# Altium footprint library PcbLib_jp.PcbLib: 255 footprints (part 8 of 16)
Each footprint in its own frame and in the unit in brackets; x right, y up, seen from the top. Pads: shape width x height; smd on the part's side, far side on the other; paste and mask are expansions set on the pad; w line width, h text height; cw(c..) or ccw(c..) is an arc to the next point about the centre after c.
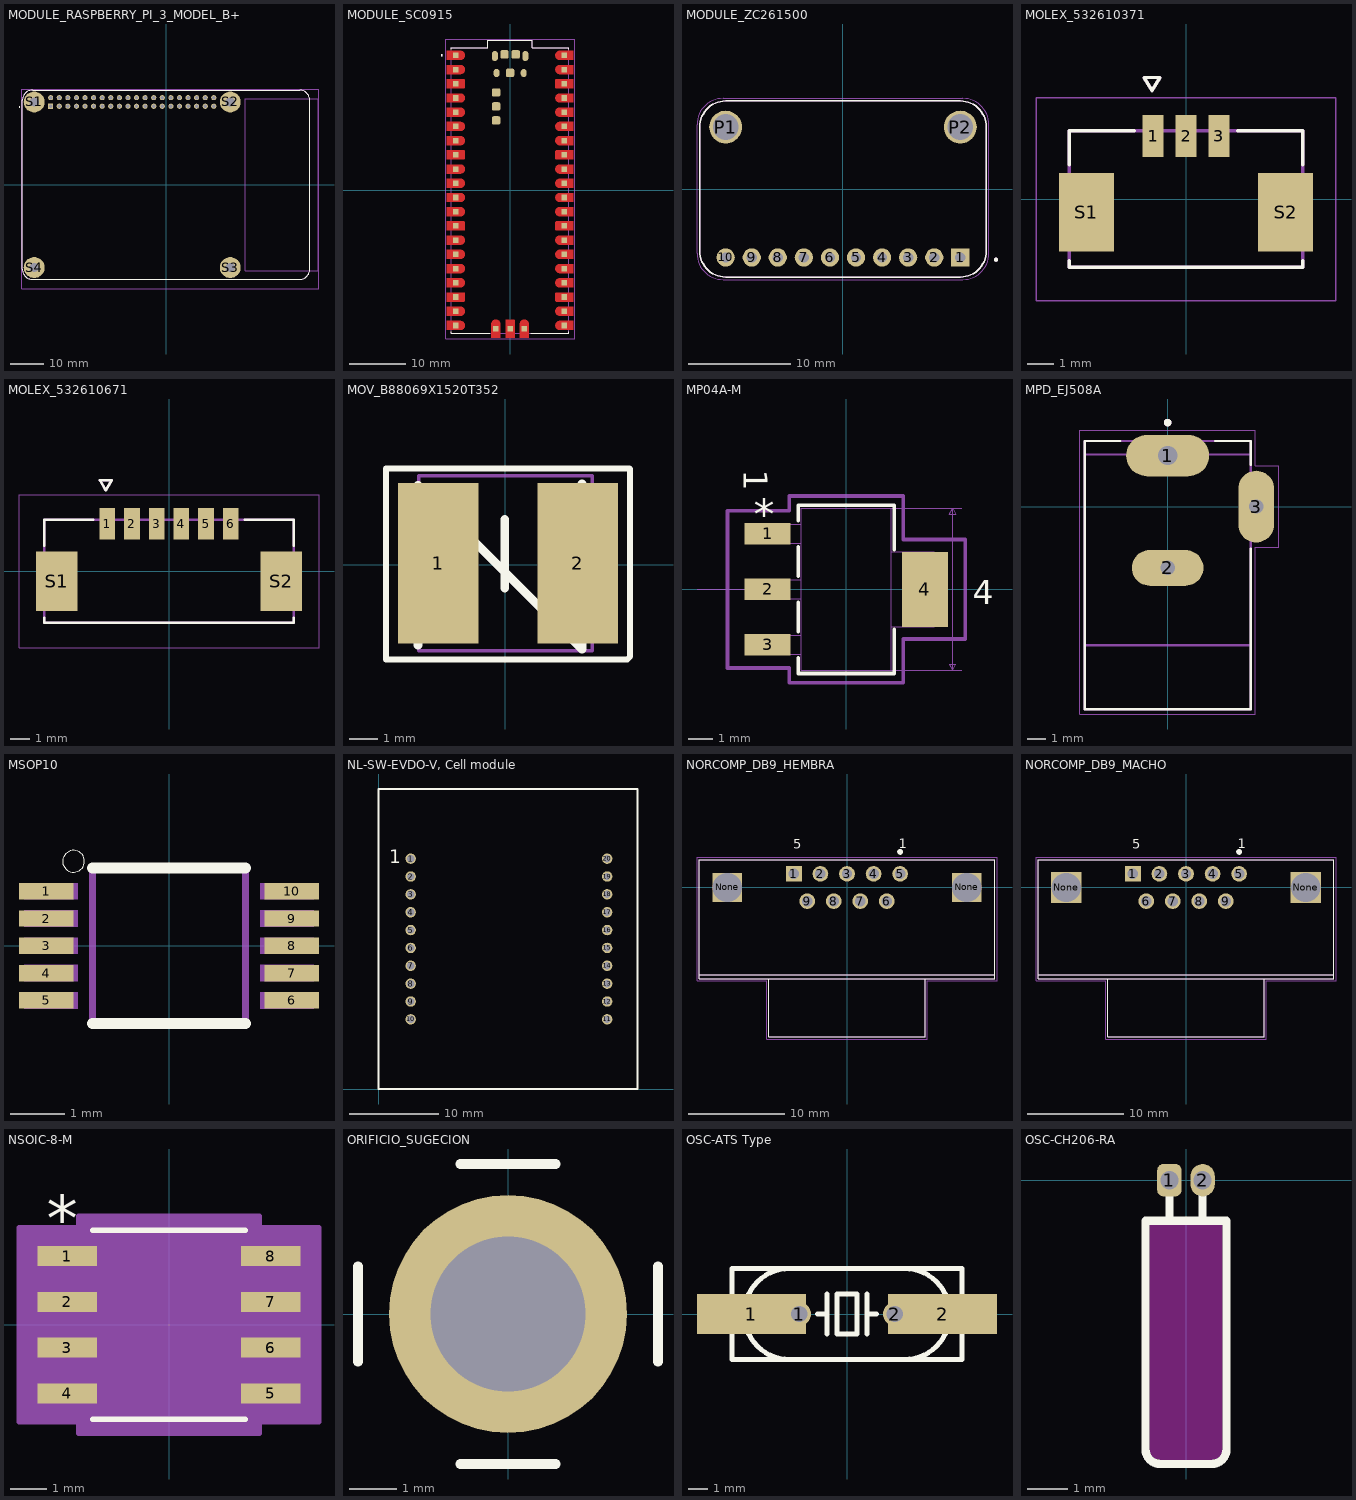
[diagram p7: the footprints below, top view; thin cyan lines are the x and y axes]

## MODULE_RASPBERRY_PI_3_MODEL_B+ [mil]
pads (44):
  rect 60x60 hole 40: 1(-1343.7,914.57)
  round 60 hole 40: 2(-1343.7,1014.57) 3(-1243.7,914.57) 4(-1243.7,1014.57) 5(-1143.7,914.57) 6(-1143.7,1014.57) 7(-1043.7,914.57) 8(-1043.7,1014.57) 9(-943.7,914.57) 10(-943.7,1014.57) 11(-843.7,914.57) 12(-843.7,1014.57) 13(-743.7,914.57) 14(-743.7,1014.57) 15(-643.7,914.57) 16(-643.7,1014.57) 17(-543.7,914.57) 18(-543.7,1014.57) 19(-443.7,914.57) 20(-443.7,1014.57) 21(-343.7,914.57) 22(-343.7,1014.57) 23(-243.7,914.57) 24(-243.7,1014.57) 25(-143.7,914.57) 26(-143.7,1014.57) 27(-43.7,914.57) 28(-43.7,1014.57) 29(56.3,914.57) 30(56.3,1014.57) 31(156.3,914.57) 32(156.3,1014.57) 33(256.3,914.57) 34(256.3,1014.57) 35(356.3,914.57) 36(356.3,1014.57) 37(456.3,914.57) 38(456.3,1014.57) 39(556.3,914.57) 40(556.3,1014.57)
  round 244.09 hole 108.27: S1(-1535.43,964.57) S2(748.03,964.57) S3(748.03,-964.57) S4(-1535.43,-964.57)
Top Overlay:
  circle w7.87: c-1708.66,905.51 r3.94
  lines w5: -1673.23,-984.25 ccw(c-1555.12,-984.25) -1555.12,-1102.36 1555.12,-1102.36 ccw(c1555.12,-984.25) 1673.23,-984.25 1673.23,984.25 ccw(c1555.12,984.25) 1555.12,1102.36 -1555.12,1102.36 ccw(c-1555.12,984.25) -1673.23,984.25 -1673.23,-984.25
Mechanical 13:
  circle w7.87: c-1708.66,905.51 r3.94
  lines w5: -1673.23,-984.25 ccw(c-1555.12,-984.25) -1555.12,-1102.36 1555.12,-1102.36 ccw(c1555.12,-984.25) 1673.23,-984.25 1673.23,984.25 ccw(c1555.12,984.25) 1555.12,1102.36 -1555.12,1102.36 ccw(c-1555.12,984.25) -1673.23,984.25 -1673.23,-984.25 ; 925.2,-1003.94 925.2,1003.94 1771.65,1003.94 1771.65,-1003.94 925.2,-1003.94
Mechanical 15:
  lines w1.97: -1683.07,-1210.63 1781.5,-1210.63 1781.5,1112.2 -1683.07,1112.2 -1683.07,-1210.63
3D body "User Library-Raspberry Pi 3-1.step": height 688.58, standoff -72.83, extent -1676.61,-1150.03 1763.23,1106.3

## MODULE_SC0915 [mm]
pads (53):
  rect 1x1 smd paste-1 mask+0: 1(-9.69,24.13) 2(-9.69,21.59) 3(-9.69,19.05) 4(-9.69,16.51) 5(-9.69,13.97) 6(-9.69,11.43) 7(-9.69,8.89) 8(-9.69,6.35) 9(-9.69,3.81) 10(-9.69,1.27) 11(-9.69,-1.27) 12(-9.69,-3.81) 13(-9.69,-6.35) 14(-9.69,-8.89) 15(-9.69,-11.43) 16(-9.69,-13.97) 17(-9.69,-16.51) 18(-9.69,-19.05) 19(-9.69,-21.59) 20(-9.69,-24.13) 21(9.69,-24.13) 22(9.69,-21.59) 23(9.69,-19.05) 24(9.69,-16.51) 25(9.69,-13.97) 26(9.69,-11.43) 27(9.69,-8.89) 28(9.69,-6.35) 29(9.69,-3.81) 30(9.69,-1.27) 31(9.69,1.27) 32(9.69,3.81) 33(9.69,6.35) 34(9.69,8.89) 35(9.69,11.43) 36(9.69,13.97) 37(9.69,16.51) 38(9.69,19.05) 39(9.69,21.59) 40(9.69,24.13) D1(-2.54,-24.7) D2(0,-24.7) D3(2.54,-24.7)
  oval 1.1x1.8 smd: A(-2.725,24) B(2.725,24)
  oval 1.05x1.45 smd: C(-2.425,20.97) D(2.425,20.97)
  rrect40% 1.5x1.5 smd: TP1(0,21) TP2(1,24.3) TP3(-1,24.3) TP4(-2.5,17.5) TP5(-2.5,15) TP6(-2.5,12.5)
Top Layer:
  drawing of 43 lines, arcs and shapes, not listed
Top Overlay:
  circle w0.2: c-12.19,24.13 r0.1
  lines w0.127: -10.5,-25.25 -10.5,-25.5 -3.66,-25.5 ; -10.5,25.25 -10.5,25.5 -4,25.5 -4,26.8 4,26.8 4,25.5 10.5,25.5 10.5,25.25 ; 3.66,-25.5 10.5,-25.5 10.5,-25.25
Top Paste:
  drawing of 43 lines, arcs and shapes, not listed
Top Solder:
  drawing of 43 lines, arcs and shapes, not listed
Mechanical 13:
  circle w0.2: c-12.19,24.13 r0.1
  lines w0.127: -10.5,-25.5 10.5,-25.5 10.5,25.5 4,25.5 4,26.8 -4,26.8 -4,25.5 -10.5,25.5 -10.5,-25.5
Mechanical 15:
  lines w0.05: -11.54,-26.55 11.54,-26.55 11.54,27.05 -11.54,27.05 -11.54,-26.55
3D body "step_temp.STEP": height 3.73, standoff 0, extent -10.5,-25.5 10.5,26.8

## MODULE_ZC261500 [mil]
pads (12):
  rect 70x70 hole 39.37: 1(450,-262.5)
  round 70 hole 39.37: 2(350,-262.5) 3(250,-262.5) 4(150,-262.5) 5(50,-262.5) 6(-50,-262.5) 7(-150,-262.5) 8(-250,-262.5) 9(-350,-262.5) 10(-450,-262.5)
  round 125.98 hole 98.43: P1(-450,237.5) P2(450,237.5)
Top Overlay:
  circle w7.87: c586.69,-271.14 r3.94
  lines w5: -550,-237.5 ccw(c-450,-237.5) -450,-337.5 450,-337.5 ccw(c450,-237.5) 550,-237.5 550,237.5 ccw(c450,237.5) 450,337.5 -450,337.5 ccw(c-450,237.5) -550,237.5 -550,-237.5
Mechanical 13:
  circle w7.87: c586.69,-271.14 r3.94
  lines w5: -550,-237.5 ccw(c-450,-237.5) -450,-337.5 450,-337.5 ccw(c450,-237.5) 550,-237.5 550,237.5 ccw(c450,237.5) 450,337.5 -450,337.5 ccw(c-450,237.5) -550,237.5 -550,-237.5
Mechanical 15:
  lines w1.97: -559.84,-247.34 ccw(c-459.84,-247.34) -459.84,-347.34 459.84,-347.34 ccw(c459.84,-247.34) 559.84,-247.34 559.84,247.34 ccw(c459.84,247.34) 459.84,347.34 -459.84,347.34 ccw(c-459.84,247.34) -559.84,247.34 -559.84,-247.34
3D body: height 10, standoff 0, extent 1118,379 1118,379
3D body "User Library-ads1115_16bit_i2c_adc.STEP": height 181.1, standoff 78.74, extent -547,-337 553,338

## MOLEX_532610371 [mm]
height 3.4
pads (5):
  rect 0.8x1.6 smd mask+0.076: 1(-1.25,2.4) 2(0,2.4) 3(1.25,2.4)
  rect 2.1x3 smd mask+0.076: S1(-3.8,-0.5) S2(3.8,-0.5)
Top Overlay:
  lines w0.127: -4.45,-2.35 -4.45,-2.6 4.45,-2.6 4.45,-2.35 ; -4.45,1.3 -4.45,2.6 -1.97,2.6 ; 1.97,2.6 4.45,2.6 4.45,1.3 ; -1.595,4.635 -0.995,4.635 -1.295,4.135 -1.595,4.635
Mechanical 13:
  lines w0.127: -4.45,-2.6 4.45,-2.6 4.45,2.6 -4.45,2.6 -4.45,-2.6 ; -1.595,4.635 -0.995,4.635 -1.295,4.135 -1.595,4.635
Mechanical 15:
  lines w0.05: -5.72,-3.87 5.72,-3.87 5.72,3.87 -5.72,3.87 -5.72,-3.87
3D body "532610371--3DModel-STEP-231308.STEP": height 3.4, standoff 0, extent -4.45,-2.545 4.45,2.655

## MOLEX_532610671 [mm]
height 3.4
pads (8):
  rect 0.8x1.6 smd mask+0.076: 1(-3.125,2.4) 2(-1.875,2.4) 3(-0.625,2.4) 4(0.625,2.4) 5(1.875,2.4) 6(3.125,2.4)
  rect 2.1x3 smd mask+0.076: S1(-5.675,-0.5) S2(5.675,-0.5)
Top Overlay:
  lines w0.127: -6.325,-2.35 -6.325,-2.6 6.325,-2.6 6.325,-2.35 ; -6.325,1.3 -6.325,2.6 -3.845,2.6 ; 3.845,2.6 6.325,2.6 6.325,1.3 ; -3.5,4.605 -2.9,4.605 -3.2,4.105 -3.5,4.605
Mechanical 13:
  lines w0.127: -6.325,-2.6 6.325,-2.6 6.325,2.6 -6.325,2.6 -6.325,-2.6 ; -3.5,4.605 -2.9,4.605 -3.2,4.105 -3.5,4.605
Mechanical 15:
  lines w0.05: -7.595,-3.87 7.595,-3.87 7.595,3.87 -7.595,3.87 -7.595,-3.87
3D body "step_temp.STEP": height 3.6, standoff 0.2, extent -6.147,-2.296 6.503,2.904

## MOV_B88069X1520T352 [mm]
height 9.3
pads (2):
  rect 2.8x5.6 smd: 1(-2.337,0.051) 2(2.515,0.051)
Top Overlay:
  lines w0.203: -4.166,-3.302 4.242,-3.302 4.343,-3.2 4.343,3.327 4.318,3.353 -4.166,3.353 ; -4.166,-3.226 -4.166,3.277
  lines w0.305: -3.048,-2.794 -3.048,2.769 2.667,-2.946 2.667,2.819 ; -0.025,-0.813 -0.025,1.575
Mechanical 13:
  lines w0.127: -3.025,-2.997 3.025,-2.997 3.025,3.099 -3.025,3.099 -3.025,-2.997
Mechanical 15:
  lines w0.05: -4.14,-3.277 4.318,-3.277 4.318,3.353 -4.14,3.353 -4.14,-3.277
3D body "CG5250.STEP": height 5.7, standoff 0.3, extent -2.322,-2.642 2.678,2.758

## MP04A-M [mil]
pads (4):
  rect 75x35 smd paste+0 mask+0: 1(-128,90.55) 2(-128,0) 3(-128,-90.55)
  rect 75x122 smd paste+0 mask+0: 4(128,0)
Top Overlay:
  lines w6: -78,-111.97 -78,-137 78,-137 78,-64.92 ; -78,-69.13 -78,-21.42 ; -78,21.42 -78,69.13 ; -78,111.97 -78,137 78,137 78,64.92
  text "*" at -150.5,98.05 h50
  text "1" at -167,195 h39.37
  text "4" at 206,-24 h39.37
Mechanical 7:
  lines w1: -243,0 -128,0 ; 0,-132 188,-132 ; 0,132 188,132 ; 173,-132 173,132 ; 173,-132 168,-122 178,-122 173,-132 ; 173,132 168,122 178,122 173,132
Mechanical 13:
  lines w1: -143.5,-106.05 -143.5,-75.05 -73,-75.05 -73,-106.05 -143.5,-106.05 ; -143.5,-15.5 -143.5,15.5 -73,15.5 -73,-15.5 -143.5,-15.5 ; -143.5,75.05 -143.5,106.05 -73,106.05 -73,75.05 -143.5,75.05 ; -73,-132 73,-132 73,132 -73,132 -73,-132 ; 73,-61 73,61 143.5,61 143.5,-61 73,-61
  text "*" at -75.5,78.05 h50
Mechanical 15:
  lines w6: -193.5,-128.05 -93,-128.05 -93,-152 93,-152 93,-81 193.5,-81 193.5,81 93,81 93,152 -93,152 -93,128.05 -193.5,128.05 -193.5,-128.05
3D body "MP04A-M.step": height 71.1, standoff 0, extent -142.5,-132 144.51,132.01
3D body: height 10, standoff 0, extent 0,0 10,10

## MPD_EJ508A [mm]
pads (3):
  oval 4.4x2.2 hole 1.02 square: 1(0,2.705)
  oval 3.8x1.9 hole 0.76 square: 2(0,-3.25)
  oval 1.9x3.8 hole 0.76 square: 3(4.69,0)
Top Overlay:
  circle w0.2: c0,4.45 r0.1
  lines w0.127: -2.52,3.475 -4.4,3.475 -4.4,-10.74 4.4,-10.74 4.4,-2.22 ; 2.52,3.475 4.4,3.475 4.4,2.22
Mechanical 13:
  circle w0.2: c0,4.45 r0.1
  lines w0.127: -4.4,-7.34 -4.4,2.76 ; -4.4,-7.34 -4.4,-10.74 4.4,-10.74 4.4,-7.34 ; -4.4,-7.34 4.4,-7.34 ; -4.4,2.76 -4.4,3.475 4.4,3.475 4.4,2.76 ; -4.4,2.76 4.4,2.76 ; 4.4,-7.34 4.4,2.76
Mechanical 15:
  lines w0.05: -4.65,-10.99 -4.65,4.05 4.65,4.05 4.65,2.15 5.89,2.15 5.89,-2.15 4.65,-2.15 4.65,-10.99 -4.65,-10.99
3D body "User Library-PJ-002AH.STEP": height 11.05, standoff -3.45, extent -4.33,-11.01 5.07,3.39

## MSOP10 [mm]
pads (10):
  rect 1x0.3 smd paste-1 mask+0.05: 1(-2.25,1) 2(-2.25,0.5) 3(-2.25,0) 4(-2.25,-0.5) 5(-2.25,-1) 6(2.25,-1) 7(2.25,-0.5) 8(2.25,0) 9(2.25,0.5) 10(2.25,1)
Top Overlay:
  circle w0: c-1.75,1.55 r0.2
  lines w0.203: -1.4,-1.425 1.4,-1.425 ; -1.4,1.425 1.4,1.425
Top Paste:
  region: -1.825,0.875 -2.7,0.875 -2.7,1.125 -1.825,1.125
  region: -1.825,0.375 -2.7,0.375 -2.7,0.625 -1.825,0.625
  region: -1.825,-0.125 -2.7,-0.125 -2.7,0.125 -1.825,0.125
  region: -1.825,-0.625 -2.7,-0.625 -2.7,-0.375 -1.825,-0.375
  region: -1.825,-1.125 -2.7,-1.125 -2.7,-0.875 -1.825,-0.875
  region: 2.7,-1.125 1.825,-1.125 1.825,-0.875 2.7,-0.875
  region: 2.7,-0.625 1.825,-0.625 1.825,-0.375 2.7,-0.375
  region: 2.7,-0.125 1.825,-0.125 1.825,0.125 2.7,0.125
  region: 2.7,0.375 1.825,0.375 1.825,0.625 2.7,0.625
  region: 2.7,0.875 1.825,0.875 1.825,1.125 2.7,1.125
Mechanical 13:
  region: -1.675,0.85 -2.65,0.85 -2.65,1.15 -1.675,1.15
  region: -1.675,0.35 -2.65,0.35 -2.65,0.65 -1.675,0.65
  region: -1.675,-0.15 -2.65,-0.15 -2.65,0.15 -1.675,0.15
  region: -1.675,-0.65 -2.65,-0.65 -2.65,-0.35 -1.675,-0.35
  region: -1.675,-1.15 -2.65,-1.15 -2.65,-0.85 -1.675,-0.85
  region: 2.65,-1.15 1.675,-1.15 1.675,-0.85 2.65,-0.85
  region: 2.65,-0.65 1.675,-0.65 1.675,-0.35 2.65,-0.35
  region: 2.65,-0.15 1.675,-0.15 1.675,0.15 2.65,0.15
  region: 2.65,0.35 1.675,0.35 1.675,0.65 2.65,0.65
  region: 2.65,0.85 1.675,0.85 1.675,1.15 2.65,1.15
  lines w0.127: -1.4,-1.425 -1.4,1.425 ; 1.4,-1.425 1.4,1.425
3D body "step_temp.STEP": height 1, standoff 0, extent -2.45,-1.5 2.45,1.5

## NL-SW-EVDO-V, Cell module [mil] "3M, 950510-6102-AR connector"
height 27.95
pads (20):
  round 46 hole 32: 1(141.73,1015.75) 3(141.73,858.27) 4(141.73,779.53) 5(141.73,700.79) 6(141.73,622.05) 7(141.73,543.31) 8(141.73,464.57) 9(141.73,385.83) 10(141.73,307.09) 11(1007.87,307.09) 12(1007.87,385.83) 13(1007.87,464.57) 14(1007.87,543.31) 15(1007.87,622.05) 16(1007.87,700.79) 17(1007.87,779.53) 18(1007.87,858.27) 20(1007.87,1015.75)
  round 45.98 hole 32.01: 2(141.73,937.01) 19(1007.87,937.01)
Top Overlay:
  lines w7: 0,0 1141.73,0 1141.73,1322.83 0,1322.83 0,0
  text "1" at 47.24,996.06 h59.06
3D body "1001764_NL-SW-LTE-QBG96_3DMODEL.step": height 570.87, standoff 144.23, extent 0,5 1140,1339.02

## NORCOMP_DB9_HEMBRA [mm]
pads (11):
  rect 1.635x1.635 hole 1.09: 1(-5.54,1.42)
  round 1.635 hole 1.09: 2(-2.77,1.42) 3(0,1.42) 4(2.77,1.42) 5(5.54,1.42) 6(4.155,-1.42) 7(1.385,-1.42) 8(-1.385,-1.42) 9(-4.155,-1.42)
  rect 3.05x3.05 hole 3.05 unplated: None(-12.495,0) None(12.495,0)
Top Overlay:
  circle w0.3: c5.54,3.714 r0.15
  lines w0.127: -15.405,-9.12 15.405,-9.12 ; -15.405,-9.12 -15.405,2.92 15.405,2.92 15.405,-9.12 ; -15.405,-9.12 -15.405,-9.5 -8.15,-9.5 ; -8.15,-9.5 -8.15,-15.59 8.15,-15.59 8.15,-9.5 ; -8.15,-9.5 8.15,-9.5 ; 8.15,-9.5 15.405,-9.5 15.405,-9.12
  text "5" at -5.613,4.064 h1
  text "1" at 5.385,4.089 h1
Mechanical 13:
  lines w0.127: -15.405,-9.5 -8.15,-9.5 ; -15.405,-9.5 -15.405,-9.12 ; -15.405,-9.5 -8.15,-9.5 ; -15.405,-9.5 -15.405,-9.12 ; -15.405,-9.12 15.405,-9.12 ; -15.405,-9.12 -15.405,2.92 ; -15.405,-9.12 15.405,-9.12 ; -15.405,-9.12 -15.405,2.92 ; -15.405,2.92 15.405,2.92 ; -15.405,2.92 15.405,2.92 ; -8.15,-15.59 8.15,-15.59 ; -8.15,-15.59 -8.15,-9.5 ; -8.15,-15.59 8.15,-15.59 ; -8.15,-15.59 -8.15,-9.5 ; -8.15,-9.5 8.15,-9.5 ; -8.15,-9.5 8.15,-9.5 ; 8.15,-15.59 8.15,-9.5 ; 8.15,-15.59 8.15,-9.5 ; 8.15,-9.5 15.405,-9.5 ; 8.15,-9.5 15.405,-9.5 ; 15.405,-9.5 15.405,-9.12 ; 15.405,-9.5 15.405,-9.12 ; 15.405,-9.12 15.405,2.92 ; 15.405,-9.12 15.405,2.92
Mechanical 16:
  lines w0.05: -15.655,-9.75 -15.655,3.17 15.655,3.17 15.655,-9.75 8.4,-9.75 8.4,-15.84 -8.4,-15.84 -8.4,-9.75 -15.655,-9.75
3D body "182-009-213.STEP": height 13.55, standoff -2.17, extent -15.354,-15.519 15.456,2.997

## NORCOMP_DB9_MACHO [mm]
pads (11):
  rect 1.635x1.635 hole 1.09: 1(-5.54,1.42)
  round 1.635 hole 1.09: 2(-2.77,1.42) 3(0,1.42) 4(2.77,1.42) 5(5.54,1.42) 6(-4.155,-1.42) 7(-1.385,-1.42) 8(1.385,-1.42) 9(4.155,-1.42)
  rect 3.2x3.2 hole 3.05 unplated: None(-12.495,0) None(12.495,0)
Top Overlay:
  circle w0.3: c5.54,3.714 r0.15
  lines w0.127: -15.405,-9.12 15.405,-9.12 ; -15.405,-9.12 -15.405,2.92 15.405,2.92 15.405,-9.12 ; -15.405,-9.12 -15.405,-9.5 -8.15,-9.5 ; -8.15,-9.5 -8.15,-15.59 8.15,-15.59 8.15,-9.5 ; -8.15,-9.5 8.15,-9.5 ; 8.15,-9.5 15.405,-9.5 15.405,-9.12
  text "5" at -5.613,4.064 h1
  text "1" at 5.385,4.089 h1
Mechanical 13:
  lines w0.127: -15.405,-9.5 -8.15,-9.5 ; -15.405,-9.5 -15.405,-9.12 ; -15.405,-9.5 -8.15,-9.5 ; -15.405,-9.5 -15.405,-9.12 ; -15.405,-9.12 15.405,-9.12 ; -15.405,-9.12 -15.405,2.92 ; -15.405,-9.12 15.405,-9.12 ; -15.405,-9.12 -15.405,2.92 ; -15.405,2.92 15.405,2.92 ; -15.405,2.92 15.405,2.92 ; -8.15,-15.59 8.15,-15.59 ; -8.15,-15.59 -8.15,-9.5 ; -8.15,-15.59 8.15,-15.59 ; -8.15,-15.59 -8.15,-9.5 ; -8.15,-9.5 8.15,-9.5 ; -8.15,-9.5 8.15,-9.5 ; 8.15,-15.59 8.15,-9.5 ; 8.15,-15.59 8.15,-9.5 ; 8.15,-9.5 15.405,-9.5 ; 8.15,-9.5 15.405,-9.5 ; 15.405,-9.5 15.405,-9.12 ; 15.405,-9.5 15.405,-9.12 ; 15.405,-9.12 15.405,2.92 ; 15.405,-9.12 15.405,2.92
Mechanical 16:
  lines w0.05: -15.655,-9.75 -15.655,3.17 15.655,3.17 15.655,-9.75 8.4,-9.75 8.4,-15.84 -8.4,-15.84 -8.4,-9.75 -15.655,-9.75
3D body "182-009-213.STEP": height 13.55, standoff -2.17, extent -15.354,-15.519 15.456,2.997

## NSOIC-8-M [mil]
pads (8):
  rect 65.5x22 smd paste+0 mask+0: 1(-111.25,75) 2(-111.25,25) 3(-111.25,-25) 4(-111.25,-75) 5(111.25,-75) 6(111.25,-25) 7(111.25,25) 8(111.25,75)
Top Overlay:
  lines w6: -83.5,-103.5 83.5,-103.5 ; -83.5,103.5 83.5,103.5
  text "*" at -133.75,92 h50
Mechanical 13:
  lines w0: -12,98.5 ccw(c0,98.5) 12,98.5
  lines w1: -122,-85 -122,-65 -78.5,-65 -78.5,-85 -122,-85 ; -122,-35 -122,-15 -78.5,-15 -78.5,-35 -122,-35 ; -122,15 -122,35 -78.5,35 -78.5,15 -122,15 ; -122,65 -122,85 -78.5,85 -78.5,65 -122,65 ; -78.5,-98.5 78.5,-98.5 78.5,98.5 -78.5,98.5 -78.5,-98.5 ; 78.5,-85 78.5,-65 122,-65 122,-85 78.5,-85 ; 78.5,-35 78.5,-15 122,-15 122,-35 78.5,-35 ; 78.5,15 78.5,35 122,35 122,15 78.5,15 ; 78.5,65 78.5,85 122,85 122,65 78.5,65
  text "*" at -76,45.5 h50
Mechanical 15:
  region: -98.5,-106 -164,-106 -164,106 -98.5,106 -98.5,118.5 98.5,118.5 98.5,106 164,106 164,-106 98.5,-106 98.5,-118.5 -98.5,-118.5
  lines w6: -164,-106 -164,106 -98.5,106 -98.5,118.5 98.5,118.5 98.5,106 164,106 164,-106 98.5,-106 98.5,-118.5 -98.5,-118.5 -98.5,-106 -164,-106
3D body "NSOIC-8.step": height 69.09, standoff 0, extent -122.01,-98.5 122.01,98.5

## ORIFICIO_SUGECION [mm] "Connector; SMB Straight"
pads (1):
  round 5 hole 3.25: ""(0,0)
Top Overlay:
  circle w0.2: c0,0 r1.8
  lines w0.2: -3.15,-1 -3.15,1 ; -1,-3.15 1,-3.15 ; -1,3.15 1,3.15 ; 3.15,-1 3.15,1
Mechanical 1:
  circle w0.025: c0,0 r0.2
  circle w0.025: c0,0 r1.05
  circle w0.025: c0,0 r1.8

## OSC-ATS Type [mm] "ATS Type Crystal"
height 4.4
pads (4):
  rect 5.5x2 smd: 1(-4.826,0) 2(4.826,0)
  round 1.2 hole 0.813 paste+0 mask+0.102: 1(-2.413,0)
  round 1.2 hole 0.813: 2(2.413,0)
Top Overlay:
  lines w0.254: -1.5,0 -1,0 ; -1,-1 -1,1 ; 1,-1 1,1 ; 1,0 1.5,0 ; -2.9,-2.3 cw(c-2.9,0) -2.9,2.3 ; -2.9,-2.3 2.9,-2.3 ; -2.9,-2.3 -5.8,-2.3 -5.8,2.3 -2.9,2.3 ; -2.9,2.3 2.9,2.3 ; 2.9,-2.3 ccw(c2.9,0) 2.9,2.3 ; 2.9,-2.3 5.8,-2.3 5.8,2.3 2.9,2.3 ; -0.5,-1 -0.5,1 0.5,1 0.5,-1 -0.5,-1
3D body "Crystal HC49_US-SM.STEP": height 4.3, standoff 0, extent -6.4,-2.415 6.4,2.415

## OSC-CH206-RA [mm]
pads (2):
  rrect50% 0.6x0.8 hole 0.45: 1(-0.41,0)
  oval 0.6x0.8 hole 0.45: 2(0.41,0)
Top Layer:
  pour cut-out: -0.051,-1.346
Top Layer keep-out:
  rectangle: -0.9,-6.998 0.9,-1.1
Top Overlay:
  lines w0.203: -0.635,-7 cw(c-0.635,-6.635) -1,-6.635 -1,-6.604 -1,-1 1,-1 1,-6.635 cw(c0.635,-6.635) 0.635,-7 -0.604,-7 ; -0.41,-1 -0.41,0 ; 0.41,-1 0.41,0
3D body "CH-206-RA.STEP": height 2.1, standoff -0.77, extent -1,-6.998 1,0.127